# Altium footprint library 排针排座.PcbLib: 344 footprints (part 19 of 22)
Each footprint in its own frame and in the unit in brackets; x right, y up, seen from the top. Pads: shape width x height; smd on the part's side, far side on the other; paste and mask are expansions set on the pad; w line width, h text height; cw(c..) or ccw(c..) is an arc to the next point about the centre after c.
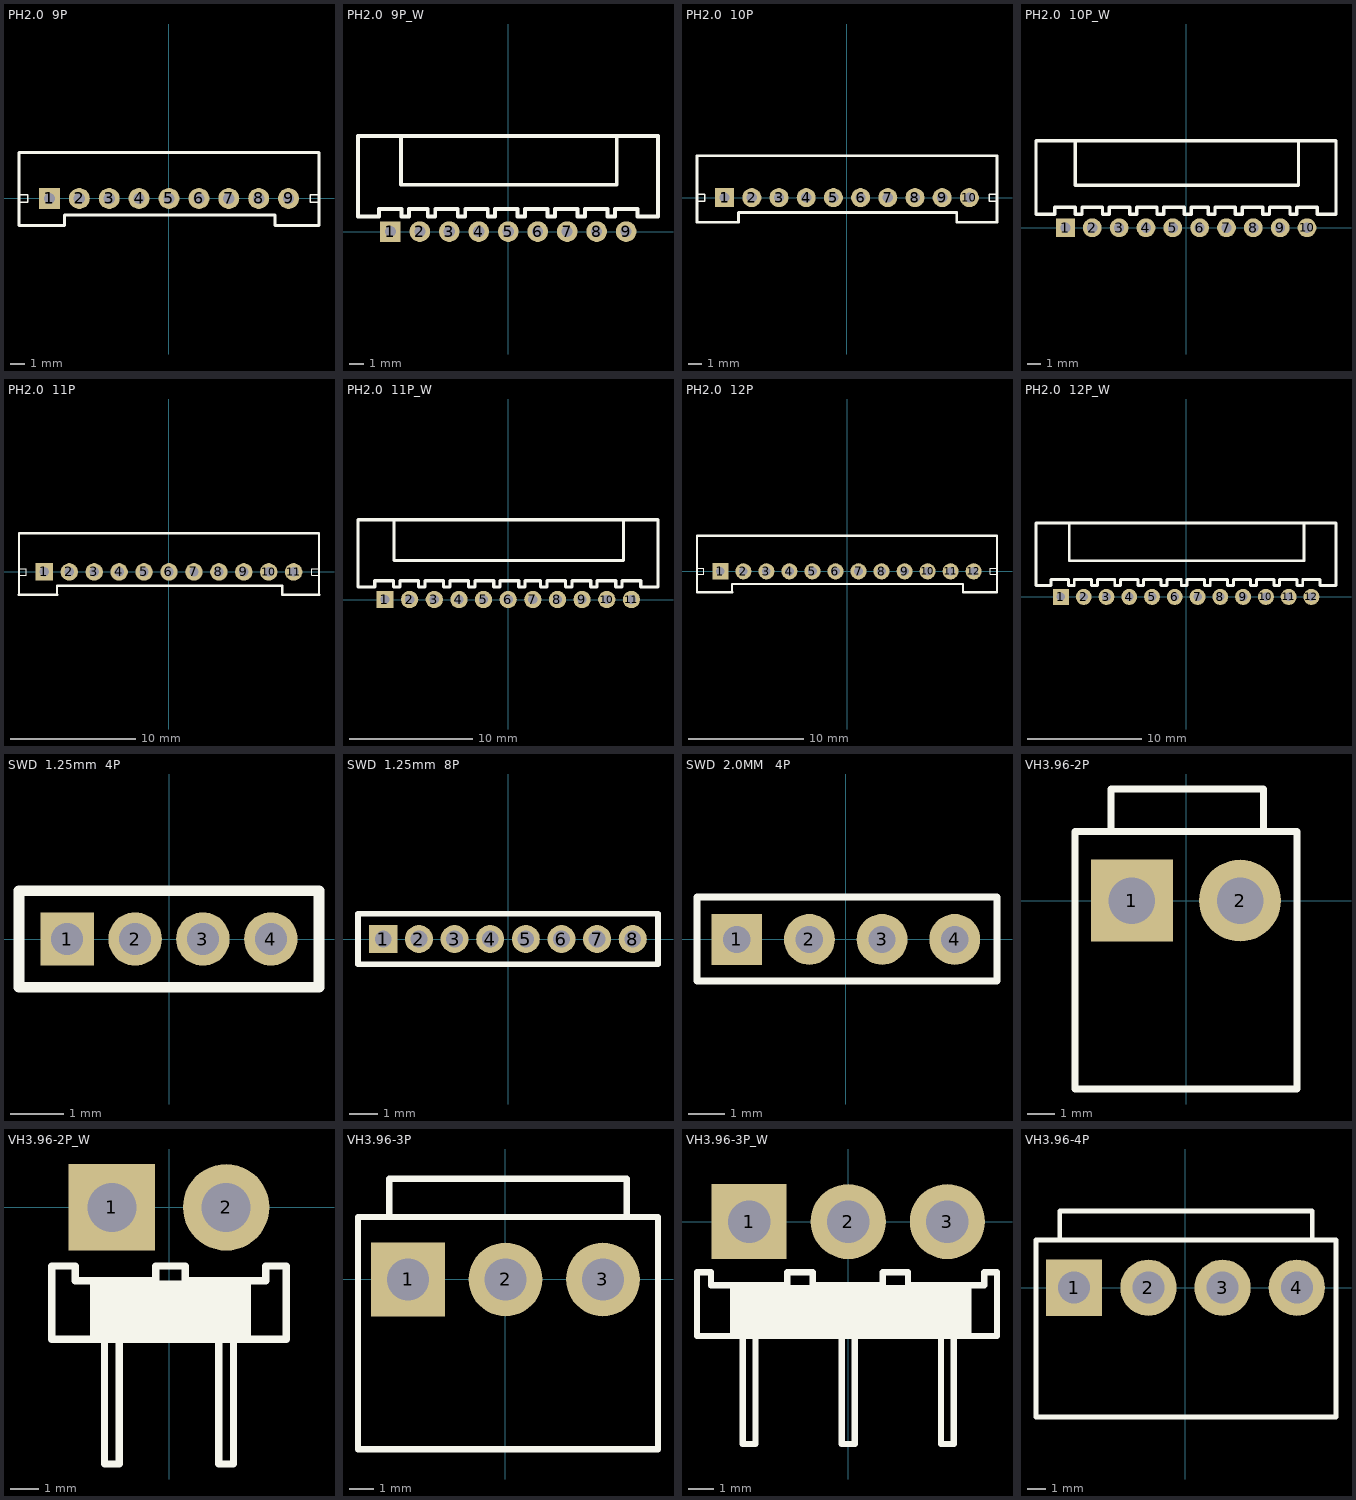
[diagram p18: the footprints below, top view; thin cyan lines are the x and y axes]

## PH2.0  9P [mm] "接插件/1A"
height 10
pads (9):
  rect 1.4x1.4 hole 0.75: 1(-8,0)
  round 1.4 hole 0.75: 2(-6,0) 3(-4,0) 4(-2,0) 5(0,0) 6(2,0) 7(4,0) 8(6,0) 9(8,0)
Top Overlay:
  lines w0.1: -10.032,-0.254 -9.452,-0.254 -9.452,0.246 -10.032,0.246 ; 10.032,-0.254 9.452,-0.254 9.452,0.246 10.032,0.246
  lines w0.2: -10.032,-1.816 -10.032,3.084 10.032,3.084 10.032,-1.816 ; -6.984,-1.816 -6.984,-1.1 7.08,-1.1 7.08,-1.816
  lines w0.203: -10.032,-1.816 -6.984,-1.816 ; 7.08,-1.816 10.032,-1.816
3D body "PH2.0-9P.STEP": height 6.02, standoff -2.98, extent -9.95,-1.7 9.95,3

## PH2.0  9P_W [mm] "接插件/1A"
height 10
pads (9):
  rect 1.4x1.4 hole 0.75: 1(-8,0)
  round 1.4 hole 0.75: 2(-6,0) 3(-4,0) 4(-2,0) 5(0,0) 6(2,0) 7(4,0) 8(6,0) 9(8,0)
Top Overlay:
  lines w0.254: -7.27,6.477 -7.27,3.175 7.365,3.175 7.365,6.477 ; -3.27,6.477 7.365,6.477 ; 4.73,6.477 -10.191,6.477 -10.191,1.016 -8.764,1.016 -8.764,1.524 -7.24,1.524 -7.24,1.016 -6.732,1.016 -6.732,1.524 -5.462,1.524 -5.462,1.016 -4.954,1.016 -4.954,1.524 -4.7,1.524 -3.43,1.524 -3.43,1.016 -2.922,1.016 -2.922,1.524 -1.398,1.524 -1.398,1.016 -0.89,1.016 -0.89,1.524 0.634,1.524 0.634,1.016 1.142,1.016 1.142,1.524 2.666,1.524 2.666,1.016 3.174,1.016 3.174,1.524 4.698,1.524 4.698,1.016 5.206,1.016 5.206,1.524 6.73,1.524 6.73,1.016 7.238,1.016 7.238,1.524 8.762,1.524 8.762,1.016 10.159,1.016 10.159,6.477 7.365,6.477
3D body "PH2.0-9P_H.STEP": height 4.72, standoff -2.68, extent -9.95,-0.3 9.95,6.3

## PH2.0  10P [mm] "接插件/1A"
height 10
pads (10):
  rect 1.4x1.4 hole 0.75: 1(-9,0)
  round 1.4 hole 0.75: 2(-7,0) 3(-5,0) 4(-3,0) 5(-1,0) 6(1,0) 7(3,0) 8(5,0) 9(7,0) 10(9,0)
Top Overlay:
  lines w0.1: -11.032,-0.254 -10.452,-0.254 -10.452,0.246 -11.032,0.246 ; 11.032,-0.254 10.452,-0.254 10.452,0.246 11.032,0.246
  lines w0.2: -11.032,-1.816 -11.032,3.084 11.032,3.084 11.032,-1.816 ; -7.984,-1.816 -7.984,-1.1 8.08,-1.1 8.08,-1.816
  lines w0.203: -11.032,-1.816 -7.984,-1.816 ; 8.08,-1.816 11.032,-1.816
3D body "PH2.0-10P.STEP": height 6.02, standoff -2.98, extent -10.95,-1.7 10.95,3

## PH2.0  10P_W [mm] "接插件/1A"
height 10
pads (10):
  rect 1.4x1.4 hole 0.75: 1(-9,0)
  round 1.4 hole 0.75: 2(-7,0) 3(-5,0) 4(-3,0) 5(-1,0) 6(1,0) 7(3,0) 8(5,0) 9(7,0) 10(9,0)
Top Overlay:
  lines w0.254: -8.27,6.477 -8.27,3.175 8.365,3.175 8.365,6.477 ; -2.27,6.477 8.365,6.477 ; 5.73,6.477 -11.191,6.477 -11.191,1.016 -9.796,1.016 -9.796,1.524 -8.272,1.524 -8.272,1.016 -7.764,1.016 -7.764,1.524 -6.24,1.524 -6.24,1.016 -5.732,1.016 -5.732,1.524 -4.208,1.524 -4.208,1.016 -3.7,1.016 -3.7,1.524 -2.176,1.524 -2.176,1.016 -1.668,1.016 -1.668,1.524 -0.144,1.524 -0.144,1.016 0.364,1.016 0.364,1.524 1.634,1.524 1.634,1.016 2.142,1.016 2.142,1.524 3.666,1.524 3.666,1.016 4.174,1.016 4.174,1.524 5.698,1.524 5.698,1.016 6.206,1.016 6.206,1.524 7.73,1.524 7.73,1.016 8.238,1.016 8.238,1.524 9.762,1.524 9.762,1.016 11.159,1.016 11.159,6.477 8.365,6.477
3D body "PH2.0-10P_H.STEP": height 4.72, standoff -2.68, extent -10.95,-0.3 10.95,6.3

## PH2.0  11P [mm] "接插件/1A"
height 10
pads (11):
  rect 1.4x1.4 hole 0.75: 1(-10,0)
  round 1.4 hole 0.75: 2(-8,0) 3(-6,0) 4(-4,0) 5(-2,0) 6(0,0) 7(2,0) 8(4,0) 9(6,0) 10(8,0) 11(10,0)
Top Overlay:
  lines w0.1: -12.032,-0.254 -11.452,-0.254 -11.452,0.246 -12.032,0.246 ; 12.032,-0.254 11.452,-0.254 11.452,0.246 12.032,0.246
  lines w0.2: -12.032,-1.816 -12.032,3.084 12.032,3.084 12.032,-1.816 ; -8.984,-1.816 -8.984,-1.1 9.08,-1.1 9.08,-1.816
  lines w0.203: -12.032,-1.816 -8.984,-1.816 ; 9.08,-1.816 12.032,-1.816
3D body "PH2.0-11P.STEP": height 6.02, standoff -2.98, extent -11.983,-1.753 11.917,2.946

## PH2.0  11P_W [mm] "接插件/1A"
height 10
pads (11):
  rect 1.4x1.4 hole 0.75: 1(-10,0)
  round 1.4 hole 0.75: 2(-8,0) 3(-6,0) 4(-4,0) 5(-2,0) 6(0,0) 7(2,0) 8(4,0) 9(6,0) 10(8,0) 11(10,0)
Top Overlay:
  lines w0.254: -9.27,6.477 -9.27,3.175 9.365,3.175 9.365,6.477 ; -1.27,6.477 9.365,6.477 ; 6.73,6.477 -12.191,6.477 -12.191,1.016 -10.828,1.016 -10.828,1.524 -9.304,1.524 -9.304,1.016 -8.796,1.016 -8.796,1.524 -7.272,1.524 -7.272,1.016 -6.764,1.016 -6.764,1.524 -5.24,1.524 -5.24,1.016 -4.732,1.016 -4.732,1.524 -3.208,1.524 -3.208,1.016 -2.7,1.016 -2.7,1.524 -1.176,1.524 -1.176,1.016 -0.668,1.016 -0.668,1.524 0.856,1.524 0.856,1.016 1.364,1.016 1.364,1.524 2.634,1.524 2.634,1.016 3.142,1.016 3.142,1.524 4.666,1.524 4.666,1.016 5.174,1.016 5.174,1.524 6.698,1.524 6.698,1.016 7.206,1.016 7.206,1.524 8.73,1.524 8.73,1.016 9.238,1.016 9.238,1.524 10.762,1.524 10.762,1.016 12.159,1.016 12.159,6.477 9.365,6.477
3D body "PH2.0-11P_H.STEP": height 4.72, standoff -2.68, extent -11.95,-0.3 11.95,6.3

## PH2.0  12P [mm] "接插件/1A"
height 10
pads (12):
  rect 1.4x1.4 hole 0.75: 1(-11,0)
  round 1.4 hole 0.75: 2(-9,0) 3(-7,0) 4(-5,0) 5(-3,0) 6(-1,0) 7(1,0) 8(3,0) 9(5,0) 10(7,0) 11(9,0) 12(11,0)
Top Overlay:
  lines w0.1: -13.032,-0.254 -12.452,-0.254 -12.452,0.246 -13.032,0.246 ; 13.032,-0.254 12.452,-0.254 12.452,0.246 13.032,0.246
  lines w0.2: -13.032,-1.816 -13.032,3.084 13.032,3.084 13.032,-1.816 ; -9.984,-1.816 -9.984,-1.1 10.08,-1.1 10.08,-1.816
  lines w0.203: -13.032,-1.816 -9.984,-1.816 ; 10.08,-1.816 13.032,-1.816
3D body "PH2.0-12P.STEP": height 6.02, standoff -2.98, extent -12.95,-1.7 12.95,3

## PH2.0  12P_W [mm] "接插件/1A"
height 10
pads (12):
  rect 1.4x1.4 hole 0.75: 1(-11,0)
  round 1.4 hole 0.75: 2(-9,0) 3(-7,0) 4(-5,0) 5(-3,0) 6(-1,0) 7(1,0) 8(3,0) 9(5,0) 10(7,0) 11(9,0) 12(11,0)
Top Overlay:
  lines w0.254: -10.27,6.477 -10.27,3.175 10.365,3.175 10.365,6.477 ; -0.27,6.477 10.365,6.477 ; 7.73,6.477 -13.191,6.477 -13.191,1.016 -11.86,1.016 -11.86,1.524 -10.336,1.524 -10.336,1.016 -9.828,1.016 -9.828,1.524 -8.304,1.524 -8.304,1.016 -7.796,1.016 -7.796,1.524 -6.272,1.524 -6.272,1.016 -5.764,1.016 -5.764,1.524 -4.24,1.524 -4.24,1.016 -3.732,1.016 -3.732,1.524 -2.208,1.524 -2.208,1.016 -1.7,1.016 -1.7,1.524 -0.43,1.524 -0.43,1.016 0.078,1.016 0.078,1.524 1.602,1.524 1.602,1.016 2.11,1.016 2.11,1.524 3.634,1.524 3.634,1.016 4.142,1.016 4.142,1.524 5.666,1.524 5.666,1.016 6.174,1.016 6.174,1.524 7.698,1.524 7.698,1.016 8.206,1.016 8.206,1.524 9.73,1.524 9.73,1.016 10.238,1.016 10.238,1.524 11.762,1.524 11.762,1.016 13.159,1.016 13.159,6.477 10.365,6.477
3D body "PH2.0-12P_H.STEP": height 4.72, standoff -2.68, extent -12.95,-0.3 12.95,6.3

## SWD  1.25mm  4P [mm]
pads (4):
  rect 1x1 hole 0.6: 1(-1.905,0)
  round 1 hole 0.6: 2(-0.635,0) 3(0.635,0) 4(1.905,0)
Top Overlay:
  lines w0.2: -2.805,-0.9 2.805,-0.9 2.805,0.9 -2.805,0.9 -2.805,-0.9

## SWD  1.25mm  8P [mm]
pads (8):
  rect 1x1 hole 0.6: 1(-4.445,0)
  round 1 hole 0.6: 2(-3.175,0) 3(-1.905,0) 4(-0.635,0) 5(0.635,0) 6(1.905,0) 7(3.175,0) 8(4.445,0)
Top Overlay:
  lines w0.2: -5.345,-0.9 -5.345,0.9 5.345,0.9 5.345,-0.9 -5.345,-0.9

## SWD  2.0MM   4P [mm] "烧录口   2.0MM"
pads (4):
  rect 1.4x1.4 hole 0.75: 1(-3,0)
  round 1.4 hole 0.75: 2(-1,0) 3(1,0) 4(3,0)
Top Overlay:
  lines w0.2: -4.092,-1.143 4.163,-1.143 4.163,1.168 -4.092,1.168 -4.092,-1.143

## VH3.96-2P [mm] "接插件，25V/5A"
pads (2):
  rect 3x3 hole 1.7: 1(-1.981,0)
  round 3 hole 1.7: 2(1.981,0)
Top Overlay:
  lines w0.254: -2.743,2.54 -2.743,4.089 2.845,4.089 2.845,2.54 ; -4.064,-6.9 -4.064,2.54 4.064,2.54 4.064,-6.9 -4.064,-6.9
3D body "VH3.96右.STEP": height 10.5, standoff -3.3, extent -0.021,-4.4 4.029,4.16
3D body "VH3.96-左.STEP": height 10.5, standoff -3.3, extent -3.981,-4.4 0.069,4.16

## VH3.96-2P_W [mm] "接插件，25V/5A"
pads (2):
  rect 3x3 hole 1.7: 1(-1.981,0)
  round 3 hole 1.7: 2(1.981,0)
Top Overlay:
  rectangle: -2.743,-4.572 2.845,-2.54
  lines w0.254: 1.626,-4.572 2.235,-4.572 2.235,-8.89 1.981,-8.89 1.727,-8.89 1.727,-4.572 ; 4.064,-4.572 4.064,-2.032 ; 4.064,-4.572 -2.235,-4.572 -2.235,-8.89 -1.981,-8.89 -1.727,-8.89 -1.727,-4.572 -2.337,-4.572 -4.064,-4.572 -4.064,-2.032 -3.251,-2.032 -3.251,-2.54 -0.457,-2.54 -0.457,-2.032 0.559,-2.032 0.559,-2.54 3.353,-2.54 3.353,-2.032 4.064,-2.032 ; 4.064,-4.572 4.064,-2.032
3D body "VH3.96_H右.STEP": height 8.76, standoff -3.55, extent -4.006,-12 0.044,0.6
3D body "VH3.96-左H.STEP": height 8.76, standoff -3.55, extent -0.044,-12 4.006,0.6

## VH3.96-3P [mm] "接插件，25V/5A"
pads (3):
  rect 3x3 hole 1.7: 1(-3.961,0)
  round 3 hole 1.7: 2(0.001,0) 3(3.961,0)
Top Overlay:
  lines w0.254: -4.723,2.54 -4.723,4.089 4.929,4.089 4.929,2.54 ; -5.993,-6.9 6.199,-6.9 6.199,2.54 -5.993,2.54 -5.993,-6.9
3D body "VH3.96-中.STEP": height 10.5, standoff -3.3, extent -2.001,-4.4 2.049,4.16
3D body "VH3.96-左.STEP": height 10.5, standoff -3.3, extent -5.961,-4.4 -1.911,4.16
3D body "VH3.96右.STEP": height 10.5, standoff -3.3, extent 1.959,-4.4 6.009,4.16

## VH3.96-3P_W [mm] "接插件，25V/5A"
pads (3):
  rect 3x3 hole 1.7: 1(-3.96,0)
  round 3 hole 1.7: 2(0.002,0) 3(3.96,0)
Top Overlay:
  rectangle: -4.722,-4.572 4.93,-2.54
  lines w0.254: -0.353,-4.572 0.256,-4.572 0.256,-8.89 0.002,-8.89 -0.252,-8.89 -0.252,-4.572 ; 3.604,-4.572 4.214,-4.572 4.214,-8.89 3.96,-8.89 3.706,-8.89 3.706,-4.572 ; -6.043,-4.572 -4.316,-4.572 -3.706,-4.572 -3.706,-8.89 -3.96,-8.89 -4.214,-8.89 -4.214,-4.572 5.946,-4.572 5.946,-2.032 5.438,-2.032 5.438,-2.54 2.39,-2.54 2.39,-2.032 2.085,-2.032 1.374,-2.032 1.374,-2.54 -1.42,-2.54 -1.42,-2.032 -2.436,-2.032 -2.436,-2.54 -5.484,-2.54 -5.484,-2.032 -6.043,-2.032 -6.043,-4.572
3D body "VH3.96-中H.STEP": height 8.76, standoff -3.55, extent -2.025,-12 2.025,0.6
3D body "VH3.96-左H.STEP": height 8.76, standoff -3.55, extent 1.935,-12 5.985,0.6
3D body "VH3.96_H右.STEP": height 8.76, standoff -3.55, extent -5.985,-12 -1.935,0.6

## VH3.96-4P [mm] "接插件，25V/5A"
pads (4):
  rect 3x3 hole 1.7: 1(-5.941,0)
  round 3 hole 1.7: 2(-1.979,0) 3(1.981,0) 4(5.941,0)
Top Overlay:
  lines w0.254: -6.703,2.54 -6.703,4.089 6.759,4.089 6.759,2.54 ; -7.973,-6.9 8.029,-6.9 8.029,2.54 -7.973,2.54 -7.973,-6.9
3D body "VH3.96右.STEP": height 10.5, standoff -3.3, extent 3.939,-4.4 7.989,4.16
3D body "VH3.96-中.STEP": height 10.5, standoff -3.3, extent -0.021,-4.4 4.029,4.16
3D body "VH3.96-中.STEP": height 10.5, standoff -3.3, extent -3.981,-4.4 0.069,4.16
3D body "VH3.96-左.STEP": height 10.5, standoff -3.3, extent -7.941,-4.4 -3.891,4.16